# Altium footprint library IC.PcbLib: 220 footprints (part 4 of 14)
Each footprint in its own frame and in the unit in brackets; x right, y up, seen from the top. Pads: shape width x height; smd on the part's side, far side on the other; paste and mask are expansions set on the pad; w line width, h text height; cw(c..) or ccw(c..) is an arc to the next point about the centre after c.
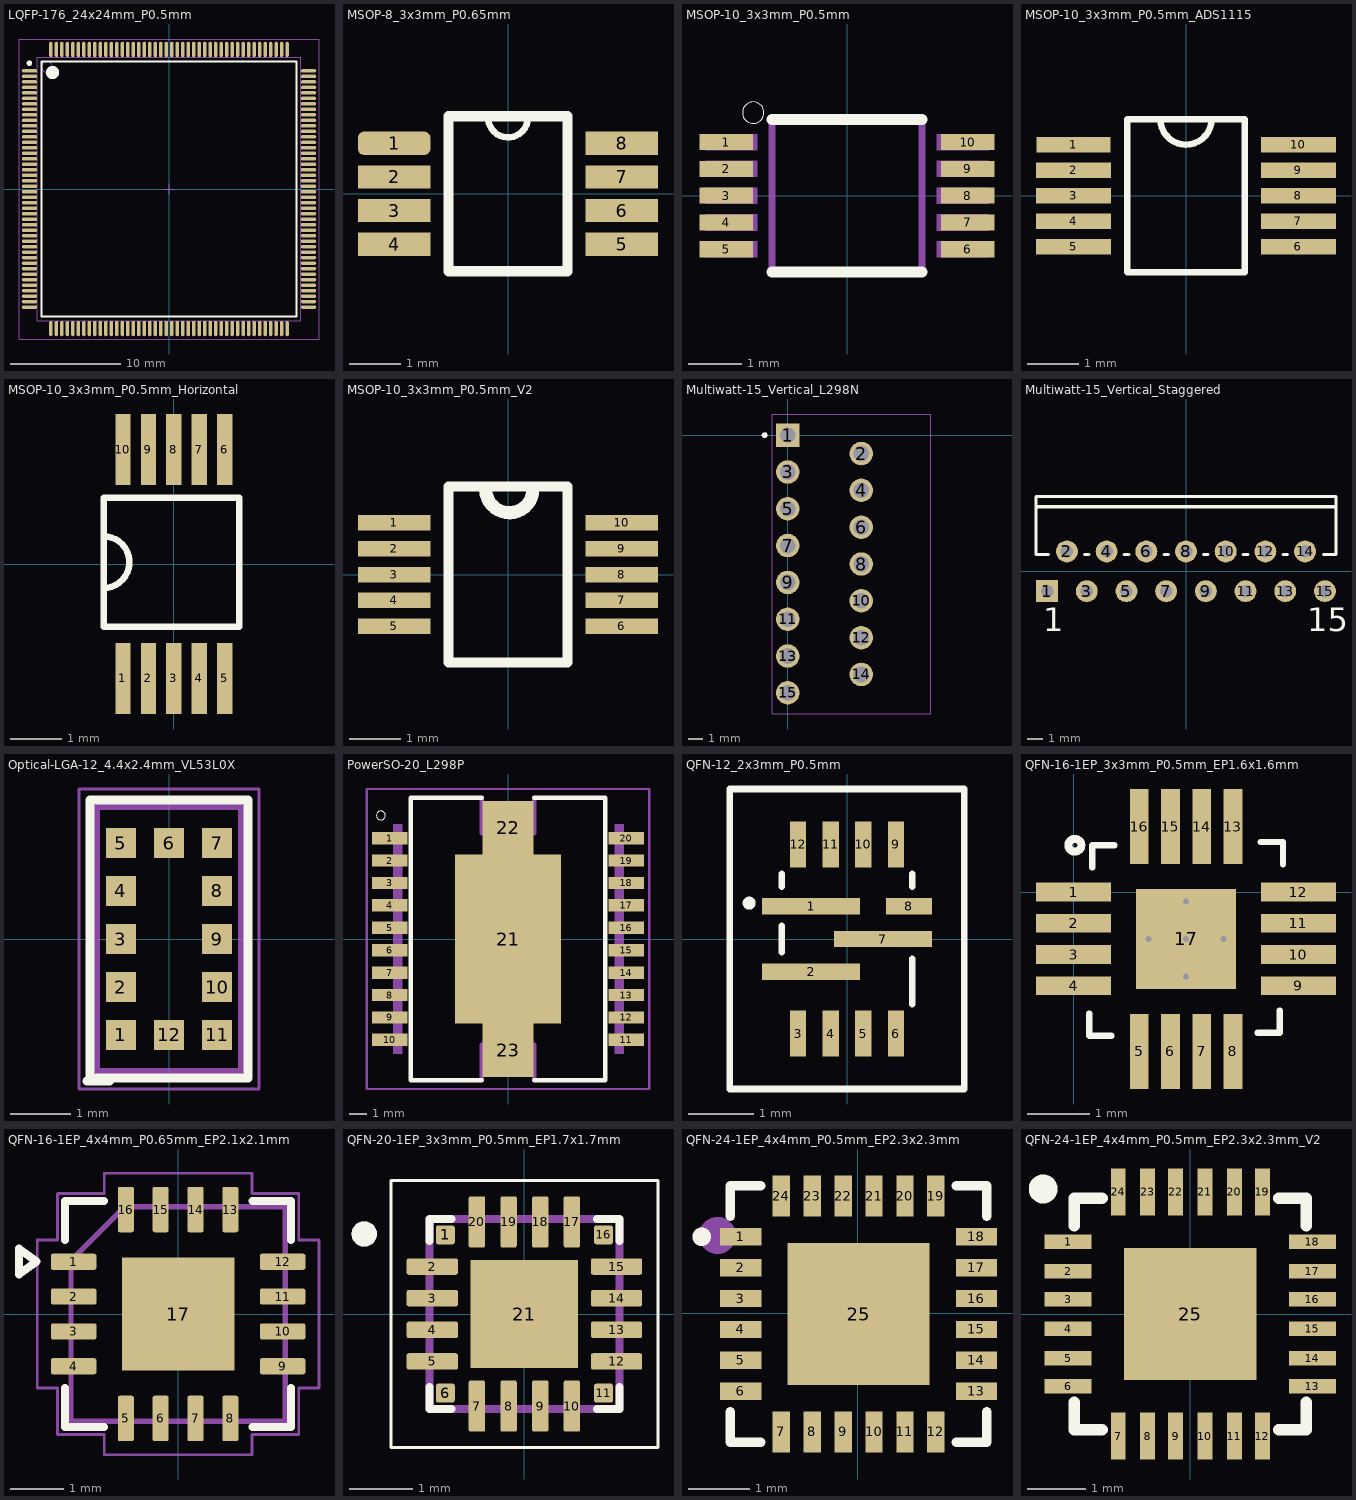
[diagram p3: the footprints below, top view; thin cyan lines are the x and y axes]

## LQFP-176_24x24mm_P0.5mm [mm] "LQFP-176, body 24x24mm, pitch 0.5mm"
height 1.6
pads (176):
  oval 1.4x0.3 smd: 1(-12.7,10.75) 2(-12.7,10.25) 3(-12.7,9.75) 4(-12.7,9.25) 5(-12.7,8.75) 6(-12.7,8.25) 7(-12.7,7.75) 8(-12.7,7.25) 9(-12.7,6.75) 10(-12.7,6.25) 11(-12.7,5.75) 12(-12.7,5.25) 13(-12.7,4.75) 14(-12.7,4.25) 15(-12.7,3.75) 16(-12.7,3.25) 17(-12.7,2.75) 18(-12.7,2.25) 19(-12.7,1.75) 20(-12.7,1.25) 21(-12.7,0.75) 22(-12.7,0.25) 23(-12.7,-0.25) 24(-12.7,-0.75) 25(-12.7,-1.25) 26(-12.7,-1.75) 27(-12.7,-2.25) 28(-12.7,-2.75) 29(-12.7,-3.25) 30(-12.7,-3.75) 31(-12.7,-4.25) 32(-12.7,-4.75) 33(-12.7,-5.25) 34(-12.7,-5.75) 35(-12.7,-6.25) 36(-12.7,-6.75) 37(-12.7,-7.25) 38(-12.7,-7.75) 39(-12.7,-8.25) 40(-12.7,-8.75) 41(-12.7,-9.25) 42(-12.7,-9.75) 43(-12.7,-10.25) 44(-12.7,-10.75) 89(12.7,-10.75) 90(12.7,-10.25) 91(12.7,-9.75) 92(12.7,-9.25) 93(12.7,-8.75) 94(12.7,-8.25) 95(12.7,-7.75) 96(12.7,-7.25) 97(12.7,-6.75) 98(12.7,-6.25) 99(12.7,-5.75) 100(12.7,-5.25) 101(12.7,-4.75) 102(12.7,-4.25) 103(12.7,-3.75) 104(12.7,-3.25) 105(12.7,-2.75) 106(12.7,-2.25) 107(12.7,-1.75) 108(12.7,-1.25) 109(12.7,-0.75) 110(12.7,-0.25) 111(12.7,0.25) 112(12.7,0.75) 113(12.7,1.25) 114(12.7,1.75) 115(12.7,2.25) 116(12.7,2.75) 117(12.7,3.25) 118(12.7,3.75) 119(12.7,4.25) 120(12.7,4.75) 121(12.7,5.25) 122(12.7,5.75) 123(12.7,6.25) 124(12.7,6.75) 125(12.7,7.25) 126(12.7,7.75) 127(12.7,8.25) 128(12.7,8.75) 129(12.7,9.25) 130(12.7,9.75) 131(12.7,10.25) 132(12.7,10.75)
  oval 0.3x1.4 smd: 45(-10.75,-12.7) 46(-10.25,-12.7) 47(-9.75,-12.7) 48(-9.25,-12.7) 49(-8.75,-12.7) 50(-8.25,-12.7) 51(-7.75,-12.7) 52(-7.25,-12.7) 53(-6.75,-12.7) 54(-6.25,-12.7) 55(-5.75,-12.7) 56(-5.25,-12.7) 57(-4.75,-12.7) 58(-4.25,-12.7) 59(-3.75,-12.7) 60(-3.25,-12.7) 61(-2.75,-12.7) 62(-2.25,-12.7) 63(-1.75,-12.7) 64(-1.25,-12.7) 65(-0.75,-12.7) 66(-0.25,-12.7) 67(0.25,-12.7) 68(0.75,-12.7) 69(1.25,-12.7) 70(1.75,-12.7) 71(2.25,-12.7) 72(2.75,-12.7) 73(3.25,-12.7) 74(3.75,-12.7) 75(4.25,-12.7) 76(4.75,-12.7) 77(5.25,-12.7) 78(5.75,-12.7) 79(6.25,-12.7) 80(6.75,-12.7) 81(7.25,-12.7) 82(7.75,-12.7) 83(8.25,-12.7) 84(8.75,-12.7) 85(9.25,-12.7) 86(9.75,-12.7) 87(10.25,-12.7) 88(10.75,-12.7) 133(10.75,12.7) 134(10.25,12.7) 135(9.75,12.7) 136(9.25,12.7) 137(8.75,12.7) 138(8.25,12.7) 139(7.75,12.7) 140(7.25,12.7) 141(6.75,12.7) 142(6.25,12.7) 143(5.75,12.7) 144(5.25,12.7) 145(4.75,12.7) 146(4.25,12.7) 147(3.75,12.7) 148(3.25,12.7) 149(2.75,12.7) 150(2.25,12.7) 151(1.75,12.7) 152(1.25,12.7) 153(0.75,12.7) 154(0.25,12.7) 155(-0.25,12.7) 156(-0.75,12.7) 157(-1.25,12.7) 158(-1.75,12.7) 159(-2.25,12.7) 160(-2.75,12.7) 161(-3.25,12.7) 162(-3.75,12.7) 163(-4.25,12.7) 164(-4.75,12.7) 165(-5.25,12.7) 166(-5.75,12.7) 167(-6.25,12.7) 168(-6.75,12.7) 169(-7.25,12.7) 170(-7.75,12.7) 171(-8.25,12.7) 172(-8.75,12.7) 173(-9.25,12.7) 174(-9.75,12.7) 175(-10.25,12.7) 176(-10.75,12.7)
Top Overlay:
  circle w0.6: c-10.6,10.6 r0.3
  circle w0.25: c-12.7,11.45 r0.125
  lines w0.2: -11.6,-11.6 11.6,-11.6 11.6,11.6 -11.6,11.6 -11.6,-11.6
Mechanical 13:
  circle w0.1: c-11.1,11.1 r0.5
  lines w0.1: -12,-12 12,-12 12,12 -12,12 -12,-12
Mechanical 15:
  lines w0.05: -13.65,-13.65 13.65,-13.65 13.65,13.65 -13.65,13.65 -13.65,-13.65
  lines w0.1: -0.5,0 0.5,0 ; 0,-0.5 0,0.5
3D body "LQFP-176_24x24mm_P0.5mm.step": height 1.53, standoff 0, extent -12,-12 12,12

## MSOP-8_3x3mm_P0.65mm [mm] "MSOP-8 (VSSOP-8), body 3x3mm, pitch 0.65mm"
height 1.1
pads (8):
  rrect50% 1.4x0.45 smd mask+0.076: 1(-2.2,0.975)
  rect 1.4x0.45 smd mask+0.076: 2(-2.2,0.325) 3(-2.2,-0.325) 4(-2.2,-0.975) 5(2.2,-0.975) 6(2.2,-0.325) 7(2.2,0.325) 8(2.2,0.975)
Top Overlay:
  lines w0.127: -0.382,1.431 ccw(c0,1.473) 0.383,1.446
  lines w0.2: -1.15,-1.5 1.15,-1.5 1.15,1.5 -1.15,1.5 -1.15,-1.5
3D body "MCP6L92T-E_MS.stp": height 1.1, standoff 0, extent -2.45,-1.5 2.45,1.5

## MSOP-10_3x3mm_P0.5mm [mm] "MSOP-10, body 3x3mm, pitch 0.5mm, span 4.5mm"
pads (10):
  rect 1x0.3 smd paste-1 mask+0: 1(-2.25,1) 2(-2.25,0.5) 3(-2.25,0) 4(-2.25,-0.5) 5(-2.25,-1) 6(2.25,-1) 7(2.25,-0.5) 8(2.25,0) 9(2.25,0.5) 10(2.25,1)
Top Overlay:
  circle w0: c-1.75,1.55 r0.2
  lines w0.203: -1.4,-1.425 1.4,-1.425 ; -1.4,1.425 1.4,1.425
Top Paste:
  region: -1.825,0.875 -2.7,0.875 -2.7,1.125 -1.825,1.125
  region: -1.825,0.375 -2.7,0.375 -2.7,0.625 -1.825,0.625
  region: -1.825,-0.125 -2.7,-0.125 -2.7,0.125 -1.825,0.125
  region: -1.825,-0.625 -2.7,-0.625 -2.7,-0.375 -1.825,-0.375
  region: -1.825,-1.125 -2.7,-1.125 -2.7,-0.875 -1.825,-0.875
  region: 2.7,-1.125 1.825,-1.125 1.825,-0.875 2.7,-0.875
  region: 2.7,-0.625 1.825,-0.625 1.825,-0.375 2.7,-0.375
  region: 2.7,-0.125 1.825,-0.125 1.825,0.125 2.7,0.125
  region: 2.7,0.375 1.825,0.375 1.825,0.625 2.7,0.625
  region: 2.7,0.875 1.825,0.875 1.825,1.125 2.7,1.125
Top Solder:
  region: -1.7,0.8 -2.8,0.8 -2.8,1.2 -1.7,1.2
  region: -1.7,0.3 -2.8,0.3 -2.8,0.7 -1.7,0.7
  region: -1.7,-0.2 -2.8,-0.2 -2.8,0.2 -1.7,0.2
  region: -1.7,-0.7 -2.8,-0.7 -2.8,-0.3 -1.7,-0.3
  region: -1.7,-1.2 -2.8,-1.2 -2.8,-0.8 -1.7,-0.8
  region: 2.8,-1.2 1.7,-1.2 1.7,-0.8 2.8,-0.8
  region: 2.8,-0.7 1.7,-0.7 1.7,-0.3 2.8,-0.3
  region: 2.8,-0.2 1.7,-0.2 1.7,0.2 2.8,0.2
  region: 2.8,0.3 1.7,0.3 1.7,0.7 2.8,0.7
  region: 2.8,0.8 1.7,0.8 1.7,1.2 2.8,1.2
Mechanical 13:
  region: -1.675,0.85 -2.65,0.85 -2.65,1.15 -1.675,1.15
  region: -1.675,0.35 -2.65,0.35 -2.65,0.65 -1.675,0.65
  region: -1.675,-0.15 -2.65,-0.15 -2.65,0.15 -1.675,0.15
  region: -1.675,-0.65 -2.65,-0.65 -2.65,-0.35 -1.675,-0.35
  region: -1.675,-1.15 -2.65,-1.15 -2.65,-0.85 -1.675,-0.85
  region: 2.65,-1.15 1.675,-1.15 1.675,-0.85 2.65,-0.85
  region: 2.65,-0.65 1.675,-0.65 1.675,-0.35 2.65,-0.35
  region: 2.65,-0.15 1.675,-0.15 1.675,0.15 2.65,0.15
  region: 2.65,0.35 1.675,0.35 1.675,0.65 2.65,0.65
  region: 2.65,0.85 1.675,0.85 1.675,1.15 2.65,1.15
  lines w0.127: -1.4,-1.425 -1.4,1.425 ; 1.4,-1.425 1.4,1.425
3D body "step_temp.STEP": height 1, standoff 0, extent -2.45,-1.5 2.45,1.5

## MSOP-10_3x3mm_P0.5mm_ADS1115 [mm] "MSOP-10 / VSSOP-10, body 3x3mm, pitch 0.5mm, ADS1115 3D"
height 1.1
pads (10):
  rect 1.45x0.3 smd mask+0.076: 1(-2.2,1)
  rect 1.47x0.3 smd mask+0.076: 2(-2.2,0.5) 3(-2.2,0) 4(-2.2,-0.5) 5(-2.2,-1) 6(2.2,-1) 7(2.2,-0.5) 8(2.2,0) 9(2.2,0.5) 10(2.2,1)
Top Overlay:
  lines w0.127: -0.5,1.5 ccw(c0,1.5) 0.5,1.499 ; -1.15,-1.5 1.15,-1.5 1.15,1.5 -1.15,1.5 -1.15,-1.5
3D body "ADS1115IDGSR--3DModel-STEP-56544.STEP": height 1.07, standoff -0.03, extent -2.45,-1.5 2.45,1.5

## MSOP-10_3x3mm_P0.5mm_Horizontal [mm] "MSOP-10 rotated 90deg, body 3x3mm, pitch 0.5mm"
height 0.95
pads (10):
  rect 0.3x1.4 smd mask+0.076: 1(-1,-2.25) 2(-0.5,-2.25) 3(0,-2.25) 4(0.5,-2.25) 5(1,-2.25) 6(1,2.25) 7(0.5,2.25) 8(0,2.25) 9(-0.5,2.25) 10(-1,2.25)
Top Overlay:
  lines w0.127: -1.381,-0.472 ccw(c-1.381,0.036) -1.381,0.544 ; -1.381,-1.234 -1.381,1.306 1.286,1.306 1.286,-1.234 -1.381,-1.234
3D body "User Library-MSOP-10-2.step": height 1.25, standoff 0, extent -1.5,-2.45 1.5,2.45

## MSOP-10_3x3mm_P0.5mm_V2 [mm] "MSOP-10 / VSSOP-10 (DGS), body 3x3mm, pitch 0.5mm, span 4.4mm"
height 1.1
pads (10):
  rect 1.4x0.3 smd mask+0.076: 1(-2.2,1) 2(-2.2,0.5) 3(-2.2,0) 4(-2.2,-0.5) 5(-2.2,-1) 6(2.2,-1) 7(2.2,-0.5) 8(2.2,0) 9(2.2,0.5) 10(2.2,1)
Top Overlay:
  lines w0.2: -1.15,-1.702 -1.15,1.702 1.15,1.702 1.15,-1.702 -1.15,-1.702
  lines w0.254: -0.431,1.626 ccw(c0.025,1.651) 0.483,1.651
3D body "BUF04701AIDGSR.stp": height 1.1, standoff 0, extent -2.45,-1.5 2.45,1.5

## Multiwatt-15_Vertical_L298N [mm] "ST L298N Multiwatt-15 vertical dual H-bridge driver, pitch 2.54mm"
pads (15):
  rect 1.62x1.62 hole 1.08: 1(0,0)
  round 1.62 hole 1.08: 2(5.08,-1.27) 3(0,-2.54) 4(5.08,-3.81) 5(0,-5.08) 6(5.08,-6.35) 7(0,-7.62) 8(5.08,-8.89) 9(0,-10.16) 10(5.08,-11.43) 11(0,-12.7) 12(5.08,-13.97) 13(0,-15.24) 14(5.08,-16.51) 15(0,-17.78)
Top Overlay:
  circle w0.2: c-1.59,0 r0.1
Mechanical 13:
  circle w0.2: c-1.59,0 r0.1
Mechanical 15:
  lines w0.05: -1.06,-19.24 9.88,-19.24 9.88,1.46 -1.06,1.46 -1.06,-19.24
3D body "l298n.stp": height 23.85, standoff -1.1, extent -0.238,-18.89 9.652,1.11

## Multiwatt-15_Vertical_Staggered [mm] "15-pin staggered through-hole vertical heatsink-mounted package"
height 17.3
pads (15):
  rect 1.4x1.4 hole 0.8: 1(-8.89,-1.27)
  round 1.4 hole 0.8: 2(-7.62,1.27) 3(-6.35,-1.27) 4(-5.08,1.27) 5(-3.81,-1.27) 6(-2.54,1.27) 7(-1.27,-1.27) 8(0,1.27) 9(1.27,-1.27) 10(2.54,1.27) 11(3.81,-1.27) 12(5.08,1.27) 13(6.35,-1.27) 14(7.62,1.27) 15(8.89,-1.27)
Top Overlay:
  lines w0.2: -9.6,4.13 9.6,4.13 ; -8.8,1.08 -9.6,1.08 -9.6,4.78 9.6,4.78 9.6,1.08 8.8,1.08 ; -6.5,1.08 -6.2,1.08 ; -3.96,1.08 -3.66,1.08 ; -1.42,1.08 -1.12,1.08 ; 1.12,1.08 1.42,1.08 ; 3.66,1.08 3.96,1.08 ; 6.2,1.08 6.5,1.08
  text "15" at 7.765,-3.845 h1.5
  text "1" at -9.14,-3.845 h1.5
3D body "User Library-MULTIWAT T15.step": height 22.74, standoff -2.18, extent -9.8,-1.778 9.8,7.29

## Optical-LGA-12_4.4x2.4mm_VL53L0X [mm] "VL53L0X, Laser time-of-flight distance sensor — Cảm biến khoảng cách laser ToF [Cam bien khoang cach laser ToF]"
height 1
pads (12):
  rect 0.5x0.5 smd mask+0.04: 1(-0.8,-1.6) 2(-0.8,-0.8) 3(-0.8,0) 4(-0.8,0.8) 5(-0.8,1.6) 6(0,1.6) 7(0.8,1.6) 8(0.8,0.8) 9(0.8,0) 10(0.8,-0.8) 11(0.8,-1.6) 12(0,-1.6)
Top Overlay:
  lines w0.15: -1.37,-2.37 -0.99,-2.37 ; -1.32,-2.32 1.32,-2.32 1.32,2.32 -1.32,2.32 -1.32,-2.32
Mechanical 2:
  lines w0.1: -1.2,-2.2 1.2,-2.2 1.2,2.2 -1.2,2.2 -1.2,-2.2
Mechanical 4:
  lines w0.05: -1.5,-2.5 1.5,-2.5 1.5,2.5 -1.5,2.5 -1.5,-2.5
3D body "Optical-LGA-12_4.4x2.4mm_VL53L0X.step": height 0, standoff 0, extent -1.05,-1.85 1.05,1.85

## PowerSO-20_L298P [mm] "ST L298P PowerSO-20 SMD dual H-bridge driver, pitch 1.27mm"
pads (23):
  rect 2x0.7 smd: 1(-6.7,5.715) 2(-6.7,4.445) 3(-6.7,3.175) 4(-6.7,1.905) 5(-6.7,0.635) 6(-6.7,-0.635) 7(-6.7,-1.905) 8(-6.7,-3.175) 9(-6.7,-4.445) 10(-6.7,-5.715) 11(6.7,-5.715) 12(6.7,-4.445) 13(6.7,-3.175) 14(6.7,-1.905) 15(6.7,-0.635) 16(6.7,0.635) 17(6.7,1.905) 18(6.7,3.175) 19(6.7,4.445) 20(6.7,5.715)
  rect 6x9.6 smd paste-6: 21(0,0)
  rect 2.9x3.05 smd paste-3: 22(0,6.3) 23(0,-6.3)
Top Overlay:
  circle w0: c-7.2,7 r0.254
  lines w0.254: -1.5,-8 -5.5,-8 -5.5,8 -1.5,8 ; 1.5,-8 5.5,-8 5.5,8 1.5,8
Top Paste:
  region: 1.9,-3.001 -1.901,-3.001 -1.901,3 1.9,3
Mechanical 13:
  circle w0.127: c0,-5 r0.671
  circle w0.127: c0,5 r0.671
  region: 6.553,4.932 6.051,4.932 6.051,6.502 6.553,6.502
  region: 6.553,3.658 6.046,3.658 6.046,5.232 6.553,5.232
  region: 6.553,2.389 6.048,2.389 6.048,3.962 6.553,3.962
  region: 6.553,1.118 6.049,1.118 6.049,2.692 6.553,2.692
  region: 6.553,-0.152 6.048,-0.152 6.048,1.422 6.553,1.422
  region: 6.553,-1.424 6.053,-1.424 6.053,0.152 6.553,0.152
  region: 6.553,-2.695 6.051,-2.695 6.051,-1.118 6.553,-1.118
  region: 6.553,-3.964 6.048,-3.964 6.048,-2.388 6.553,-2.388
  region: 6.553,-5.242 6.056,-5.242 6.056,-3.658 6.553,-3.658
  region: 6.553,-6.507 6.05,-6.507 6.05,-4.928 6.553,-4.928
  region: -5.994,-6.511 -6.511,-6.511 -6.511,-4.928 -5.994,-4.928
  region: -5.994,-5.24 -6.512,-5.24 -6.512,-3.658 -5.994,-3.658
  region: -5.994,-3.964 -6.505,-3.964 -6.505,-2.388 -5.994,-2.388
  region: -5.994,-2.697 -6.513,-2.697 -6.513,-1.118 -5.994,-1.118
  region: -5.994,-1.425 -6.514,-1.425 -6.514,0.152 -5.994,0.152
  region: -5.994,-0.153 -6.515,-0.153 -6.515,1.422 -5.994,1.422
  region: -5.994,1.12 -6.515,1.12 -6.515,2.692 -5.994,2.692
  region: -5.994,2.389 -6.507,2.389 -6.507,3.962 -5.994,3.962
  region: -5.994,3.661 -6.508,3.661 -6.508,5.232 -5.994,5.232
  region: -5.994,4.932 -6.508,4.932 -6.508,6.502 -5.994,6.502
  lines w0.254: -1.5,-8 -1.5,-6 1.5,-6 1.5,-8 ; -1.5,8 -1.5,6 1.5,6 1.5,8
Mechanical 15:
  lines w0.127: -8,-8.5 8,-8.5 8,8.5 -8,8.5 -8,-8.5
3D body "l298p.stp": height 3.14, standoff -0.14, extent -7.112,-7.899 7.074,8.001

## QFN-12_2x3mm_P0.5mm [mm] "QFN-12 without exposed pad, body 2x3mm, pitch 0.5mm"
height 1
pads (12):
  rect 1.5x0.25 smd: 1(-0.55,0.5) 2(-0.55,-0.5) 7(0.55,0)
  rect 0.25x0.7 smd: 3(-0.75,-1.45) 4(-0.25,-1.45) 5(0.25,-1.45) 6(0.75,-1.45) 9(0.75,1.45) 10(0.25,1.45) 11(-0.25,1.45) 12(-0.75,1.45)
  rect 0.7x0.25 smd: 8(0.95,0.5)
Top Overlay:
  lines w0.1: -1,-0.2 -1,0.2 ; -1,0.8 -1,1 ; 1,-1 1,-0.3 ; 1,0.8 1,1 ; -1.8,-2.3 1.8,-2.3 ; -1.8,-2.3 -1.8,2.3 ; -1.8,-2.3 -1.8,2.3 ; -1.8,-2.3 1.8,-2.3 ; -1.8,2.3 1.8,2.3 ; -1.8,2.3 1.8,2.3 ; 1.8,-2.3 1.8,2.3 ; 1.8,-2.3 1.8,2.3 ; -1.5,0.5 cw(c-1.5,0.55) -1.5,0.6 cw(c-1.5,0.55) -1.5,0.5
3D body "User Library-qfn12p300x300ll055ls050h075.step": height 0.75, standoff 0, extent -1.5,-1.5 1.5,1.5

## QFN-16-1EP_3x3mm_P0.5mm_EP1.6x1.6mm [mm] "WFQFN-16 with exposed pad 1.6x1.6mm, body 3x3mm, pitch 0.5mm"
height 0.8
pads (17):
  rect 1.2x0.3 smd mask+0.076: 1(0,0) 2(0,-0.5) 3(0,-1) 4(0,-1.5) 9(3.6,-1.5) 10(3.6,-1) 11(3.6,-0.5) 12(3.6,0)
  rect 0.3x1.2 smd mask+0.076: 5(1.05,-2.55) 6(1.55,-2.55) 7(2.05,-2.55) 8(2.55,-2.55) 13(2.55,1.05) 14(2.05,1.05) 15(1.55,1.05) 16(1.05,1.05)
  rect 1.6x1.6 smd mask+0.076: 17(1.8,-0.75)
via 1.8,-0.75 diameter 0.2 hole 0.1
via 1.8,-1.35 diameter 0.2 hole 0.1
via 1.8,-0.15 diameter 0.2 hole 0.1
via 1.2,-0.75 diameter 0.2 hole 0.1
via 2.4,-0.75 diameter 0.2 hole 0.1
Top Overlay:
  circle w0.127: c0.022,0.75 r0.103
  lines w0.1: 0.25,-1.943 0.25,-2.3 0.607,-2.3 ; 0.3,0.393 0.3,0.75 0.657,0.75 ; 2.943,-2.25 3.3,-2.25 3.3,-1.893 ; 2.993,0.8 3.35,0.8 3.35,0.443
3D body "FSA2567MPX.stp": height 0.8, standoff 0, extent 0.25,-2.3 3.35,0.8

## QFN-16-1EP_4x4mm_P0.65mm_EP2.1x2.1mm [mm] "TP5100, Buck Li-ion charger for one or two cells — IC sạc giảm áp cho một hoặc hai cell Li-ion [IC sac giam ap cho mot hoac hai cell Li-ion]"
height 0.85
pads (17):
  rrect25% 0.85x0.3 smd: 1(-1.95,0.975) 2(-1.95,0.325) 3(-1.95,-0.325) 4(-1.95,-0.975) 9(1.95,-0.975) 10(1.95,-0.325) 11(1.95,0.325) 12(1.95,0.975)
  rrect25% 0.3x0.85 smd: 5(-0.975,-1.95) 6(-0.325,-1.95) 7(0.325,-1.95) 8(0.975,-1.95) 13(0.975,1.95) 14(0.325,1.95) 15(-0.325,1.95) 16(-0.975,1.95)
  rect 2.1x2.1 smd paste-2.1: 17(0,0)
Top Overlay:
  lines w0.15: -2.11,-1.385 -2.11,-2.11 -1.385,-2.11 ; -2.11,1.385 -2.11,2.11 -1.385,2.11 ; 1.385,-2.11 2.11,-2.11 2.11,-1.385 ; 1.385,2.11 2.11,2.11 2.11,1.385 ; -2.97,0.74 -2.64,0.98 -2.97,1.22 -2.97,0.74
Top Paste:
  region: -0.95,0.1 -0.1,0.1 -0.1,0.95 -0.95,0.95
  region: -0.95,-0.95 -0.1,-0.95 -0.1,-0.1 -0.95,-0.1
  region: 0.1,0.1 0.95,0.1 0.95,0.95 0.1,0.95
  region: 0.1,-0.95 0.95,-0.95 0.95,-0.1 0.1,-0.1
Mechanical 2:
  lines w0.1: -2,-2 2,-2 2,2 -1,2 -2,1 -2,-2
Mechanical 4:
  lines w0.05: -2.63,-1.38 -2.63,1.38 -2.25,1.38 -2.25,2.25 -1.38,2.25 -1.38,2.63 1.38,2.63 1.38,2.25 2.25,2.25 2.25,1.38 2.63,1.38 2.63,-1.38 2.25,-1.38 2.25,-2.25 1.38,-2.25 1.38,-2.63 -1.38,-2.63 -1.38,-2.25 -2.25,-2.25 -2.25,-1.38 -2.63,-1.38
3D body "QFN-16-1EP_4x4mm_P0.65mm_EP2.1x2.1mm.step": height 0, standoff 0, extent -2.375,-2.375 2.375,2.375

## QFN-20-1EP_3x3mm_P0.5mm_EP1.7x1.7mm [mm] "QFN-20 with exposed pad 1.7x1.7mm, body 3x3mm, pitch 0.5mm (SI4703)"
pads (21):
  rrect25% 0.3x0.3 smd: 1(-1.25,1.25) 6(-1.25,-1.25) 11(1.25,-1.25) 16(1.25,1.25)
  rrect25% 0.81x0.26 smd: 2(-1.455,0.75) 3(-1.455,0.25) 4(-1.455,-0.25) 5(-1.455,-0.75) 12(1.455,-0.75) 13(1.455,-0.25) 14(1.455,0.25) 15(1.455,0.75)
  rrect25% 0.26x0.81 smd: 7(-0.75,-1.455) 8(-0.25,-1.455) 9(0.25,-1.455) 10(0.75,-1.455) 17(0.75,1.455) 18(0.25,1.455) 19(-0.25,1.455) 20(-0.75,1.455)
  rect 1.7x1.7 smd paste-2: 21(0,0)
Top Overlay:
  circle w0.2: c-2.529,1.264 r0.1
  lines w0.05: -2.11,-2.11 -2.11,2.11 2.11,2.11 2.11,-2.11 -2.11,-2.11
  lines w0.127: -1.5,-1.15 -1.5,-1.5 -1.15,-1.5 ; -1.5,1.15 -1.5,1.5 -1.15,1.5 ; 1.15,-1.5 1.5,-1.5 1.5,-1.15 ; 1.15,1.5 1.5,1.5 1.5,1.15
Top Paste:
  region: 0.54,-0.541 -0.541,-0.541 -0.541,0.54 0.54,0.54
Mechanical 13:
  circle w0.2: c-2.529,1.264 r0.1
  lines w0.127: -1.5,-1.5 1.5,-1.5 1.5,1.5 -1.5,1.5 -1.5,-1.5
3D body "QFN-20-1EP_3x3mm_P0.5mm_EP.step": height 0.9, standoff 0, extent -1.779,-1.559 1.779,1.559

## QFN-24-1EP_4x4mm_P0.5mm_EP2.3x2.3mm [mm] "TQFN-24 with exposed pad 2.3x2.3mm, body 4x4mm, pitch 0.5mm, span 3.81mm"
pads (25):
  rect 0.665x0.28 smd: 1(-1.895,1.236) 2(-1.895,0.736) 3(-1.895,0.236) 4(-1.895,-0.264) 5(-1.895,-0.764) 6(-1.895,-1.264) 13(1.92,-1.264) 14(1.92,-0.764) 15(1.92,-0.264) 16(1.92,0.236) 17(1.92,0.736) 18(1.92,1.236)
  rect 0.28x0.665 smd: 7(-1.238,-1.922) 8(-0.738,-1.922) 9(-0.238,-1.922) 10(0.262,-1.922) 11(0.762,-1.922) 12(1.262,-1.922) 19(1.262,1.893) 20(0.762,1.893) 21(0.262,1.893) 22(-0.238,1.893) 23(-0.738,1.893) 24(-1.238,1.893)
  rect 2.3x2.3 smd: 25(0.012,-0.014)
Top Overlay:
  circle w0.15: c-2.528,1.236 r0.075
  lines w0.152: -2.064,-1.595 -2.064,-2.09 -1.568,-2.09 ; -2.064,1.566 -2.064,2.062 -1.568,2.062 ; 1.593,-2.09 2.088,-2.09 2.088,-1.595 ; 1.593,2.062 2.088,2.062 2.088,1.566
Mechanical 15:
  circle w0.3: c-2.274,1.256 r0.15
3D body "User Library-QFN24_4x4-1.STEP": height 0.75, standoff 0, extent -1.976,-2.021 2.026,1.981

## QFN-24-1EP_4x4mm_P0.5mm_EP2.3x2.3mm_V2 [mil] "QFN-24 with exposed pad 2.29x2.29mm, body 4x4mm, span 4.22mm (LAN8720A)"
pads (25):
  rect 32x10 smd: 1(-83,49) 2(-83,29) 3(-83,10) 4(-83,-10) 5(-83,-30) 6(-83,-49) 13(83,-49) 14(83,-30) 15(83,-10) 16(83,10) 17(83,29) 18(83,49)
  rect 10x32 smd: 7(-49,-83) 8(-29,-83) 9(-10,-83) 10(10,-83) 11(30,-83) 12(49,-83) 19(49,83) 20(30,83) 21(10,83) 22(-10,83) 23(-29,83) 24(-49,83)
  rect 90x90 smd: 25(0,0)
Top Overlay:
  lines w7.9: -78.7,-60 -78.7,-78.7 -60,-78.7 ; -78.7,60 -78.7,78.7 -60,78.7 ; 60,-78.7 78.7,-78.7 78.7,-60 ; 60,78.7 78.7,78.7 78.7,60
  lines w9.8: -95,84.9 cw(c-99.9,84.95) -95,85
3D body "QFN-24 (4x4x0.9).step": height 36.22, standoff 0, extent -78.28,-79.2 79.2,78.28